# Altium schematic symbol library FPGA_Xilinx_Virtex7.SchLib: 34 symbols (part 9 of 34) (continued)
## XC7VH870T-FLG1932 (continued)
part P pins: AB22 VREFN_0 (io), AB23 VP_0 (io), AC22 VN_0 (io), AC23 VREFP_0 (io), AD22 DXN_0 (io), AD23 DXP_0 (io), AJ26 DONE_0 (io), AK19 INIT_B_0 (io), AL26 PROGRAM_B_0 (io), AM19 M2_0 (io), AM21 M1_0 (io), AM23 M0_0 (io), N20 TMS_0 (io), N22 TCK_0 (io), N26 TDO_0 (io), R20 TDI_0 (io), R26 CCLK_0 (io), V17 VCCO_0 (power), W16 VCCO_0 (power)
part Q pins: A3 GND (power), A4 GND (power), A7 GND (power), A38 GND (power), A41 GND (power), A42 GND (power), AA17 VCCINT (power), AA19 VCCAUX_IO_G2 (power), AA21 VCCINT (power), AA22 GNDADC (power), AA23 VCCADC (power), AA25 VCCAUX_IO_G0 (power), AA27 VCCINT (power), AA29 VCCINT (power), AB16 VCCINT (power), AB18 VCCAUX (power), AB20 VCCINT (power), AB24 VCCBRAM (power), AB26 VCCAUX (power), AB28 VCCINT (power), AC17 VCCINT (power), AC19 VCCAUX_IO_G2 (power), AC21 VCCINT (power), AC25 VCCAUX_IO_G0 (power), AC27 VCCINT (power), AC29 VCCINT (power), AD16 VCCINT (power), AD18 VCCAUX (power), AD20 VCCINT (power), AD24 VCCBRAM (power), AD26 VCCAUX (power), AD28 VCCINT (power), AE17 VCCINT (power), AE19 VCCINT (power), AE21 VCCINT (power), AE23 VCCINT (power), AE25 VCCINT (power), AE27 VCCINT (power), AE29 VCCINT (power), AF16 VCCINT (power), AF18 VCCAUX (power), AF20 VCCINT (power), AF22 VCCINT (power), AF24 VCCBRAM (power), AF26 VCCAUX (power), AF28 VCCINT (power), AG17 VCCINT (power), AG19 VCCINT (power), AG21 VCCINT (power), AG23 VCCINT (power), AG25 VCCINT (power), AG27 VCCINT (power), AG29 VCCINT (power), AH16 VCCINT (power), AH18 VCCAUX (power), AH20 VCCINT (power), AH22 VCCINT (power), AH24 VCCBRAM (power), AH26 VCCAUX (power), AH28 VCCINT (power), AJ17 VCCINT (power), AJ19 VCCINT (power), AJ21 VCCINT (power), AJ23 VCCINT (power), AJ25 VCCINT (power), AJ27 VCCINT (power), AK18 VCCINT (power), AK20 VCCINT (power), AK22 VCCINT (power), AK24 VCCBRAM (power), AK26 VCCINT (power), AL19 VCCINT (power), AL21 VCCINT (power), AL23 VCCINT (power), AL25 VCCINT (power), AL27 VCCINT (power), AM18 VCCINT (power), AM20 VCCINT (power), AM22 VCCINT (power), AM24 VCCBRAM (power), AM26 VCCINT (power), B2 GND (power), B5 GND (power), B7 GND (power), B38 GND (power), B40 GND (power), B43 GND (power), C4 GND (power), C7 GND (power), C38 GND (power), C41 GND (power), D1 GND (power), D6 GND (power), D7 GND (power), D38 GND (power), D39 GND (power), D44 GND (power), E3 GND (power), E4 GND (power), E7 GND (power), E8 GND (power), E9 GND (power), E10 GND (power), E11 GND (power), E12 GND (power), E13 GND (power), E14 GND (power), E15 GND (power), E16 GND (power), E17 GND (power), E19 GND (power), E22 GND (power), E23 GND (power), E26 GND (power), E27 GND (power), E28 GND (power), E29 GND (power), E30 GND (power), E31 GND (power), E32 GND (power), E33 GND (power), E34 GND (power), E35 GND (power), E36 GND (power), E37 GND (power), E38 GND (power), E41 GND (power), E42 GND (power), F1 GND (power), F2 GND (power), F6 GND (power), F9 GND (power), F17 GND (power), F19 GND (power), F21 GND (power), F23 GND (power), F25 GND (power), F27 GND (power), F28 GND (power), F36 GND (power), F39 GND (power), F43 GND (power), F44 GND (power), G4 GND (power), G7 GND (power), G8 GND (power), G9 GND (power), G14 GND (power), G17 GND (power), G19 GND (power), G22 GND (power), G23 GND (power), G24 GND (power), G25 GND (power), G28 GND (power), G34 GND (power), G36 GND (power), G37 GND (power), G38 GND (power), G41 GND (power), H1 GND (power), H6 GND (power), H9 GND (power), H11 GND (power), H17 GND (power), H18 GND (power), H19 GND (power), H20 GND (power), H21 GND (power), H23 GND (power), H24 GND (power), H25 GND (power), H27 GND (power), H28 GND (power), H31 GND (power), N19 VCCINT (power), N21 VCCINT (power), N23 VCCINT (power), N25 VCCINT (power), N27 VCCINT (power), P20 VCCINT (power), P22 VCCINT (power), P24 VCCBRAM (power), P26 VCCINT (power), R19 VCCINT (power), R21 VCCINT (power), R22 VCCBATT_0 (power), R23 VCCINT (power), R25 VCCINT (power), R27 VCCINT (power), T18 VCCINT (power), T20 VCCINT (power), T22 VCCINT (power), T24 VCCBRAM (power), T26 VCCINT (power), T28 VCCINT (power), U17 VCCINT (power), U19 VCCINT (power), U21 VCCINT (power), U23 VCCINT (power), U25 VCCINT (power), U27 VCCINT (power), U29 VCCINT (power), V16 VCCINT (power), V18 VCCAUX (power), V20 VCCINT (power), V22 VCCINT (power), V24 VCCBRAM (power), V26 VCCAUX (power), V28 VCCINT (power), W17 VCCINT (power), W19 VCCAUX_IO_G2 (power), W21 VCCINT (power), W23 VCCINT (power), W25 VCCAUX_IO_G0 (power), W27 VCCINT (power), W29 VCCINT (power), Y16 VCCINT (power), Y18 VCCAUX (power), Y20 VCCINT (power), Y22 VCCINT (power), Y24 VCCBRAM (power), Y26 VCCAUX (power), Y28 VCCINT (power)
part R pins: AA3 GND (power), AA4 GND (power), AA7 GND (power), AA11 GND (power), AA12 GND (power), AA16 GND (power), AA18 GND (power), AA20 GND (power), AA24 GND (power), AA26 GND (power), AA28 GND (power), AA32 GND (power), AA34 GND (power), AA38 GND (power), AA41 GND (power), AA42 GND (power), AB1 GND (power), AB2 GND (power), AB5 GND (power), AB9 GND (power), AB10 GND (power), AB11 GND (power), AB17 GND (power), AB19 GND (power), AB21 GND (power), AB25 GND (power), AB27 GND (power), AB29 GND (power), AB34 GND (power), AB35 GND (power), AB36 GND (power), AB40 GND (power), AB43 GND (power), AB44 GND (power), AC3 GND (power), AC7 GND (power), AC8 GND (power), AC11 GND (power), AC16 GND (power), AC18 GND (power), AC20 GND (power), AC24 GND (power), AC26 GND (power), AC28 GND (power), AC34 GND (power), AC37 GND (power), AC38 GND (power), AC42 GND (power), AD1 GND (power), AD5 GND (power), AD6 GND (power), AD9 GND (power), AD11 GND (power), AD13 GND (power), AD17 GND (power), AD19 GND (power), AD21 GND (power), AD25 GND (power), AD27 GND (power), AD29 GND (power), AD33 GND (power), AD34 GND (power), AD36 GND (power), AD39 GND (power), AD40 GND (power), AD44 GND (power), AE3 GND (power), AE4 GND (power), AE7 GND (power), AE11 GND (power), AE16 GND (power), AE18 GND (power), AE20 GND (power), AE22 GND (power), AE24 GND (power), AE26 GND (power), AE28 GND (power), AE30 GND (power), AE34 GND (power), AE38 GND (power), AE41 GND (power), AE42 GND (power), AF1 GND (power), AF2 GND (power), AF5 GND (power), AF9 GND (power), AF10 GND (power), AF11 GND (power), AF17 GND (power), AF19 GND (power), AF21 GND (power), AF23 GND (power), AF25 GND (power), AF27 GND (power), AF29 GND (power), AF34 GND (power), AF35 GND (power), AF36 GND (power), AF40 GND (power), AF43 GND (power), AF44 GND (power), AG3 GND (power), AG7 GND (power), H36 GND (power), H39 GND (power), H44 GND (power), J3 GND (power), J4 GND (power), J7 GND (power), J9 GND (power), J17 GND (power), J18 GND (power), J20 GND (power), J24 GND (power), J26 GND (power), J28 GND (power), J36 GND (power), J38 GND (power), J41 GND (power), J42 GND (power), K1 GND (power), K2 GND (power), K5 GND (power), K9 GND (power), K10 GND (power), K11 GND (power), K15 GND (power), K17 GND (power), K18 GND (power), K21 GND (power), K22 GND (power), K23 GND (power), K24 GND (power), K25 GND (power), K26 GND (power), K27 GND (power), K28 GND (power), K34 GND (power), K35 GND (power), K36 GND (power), K40 GND (power), K43 GND (power), K44 GND (power), L3 GND (power), L7 GND (power), L8 GND (power), L11 GND (power), L12 GND (power), L18 GND (power), L19 GND (power), L21 GND (power), L23 GND (power), L25 GND (power), L27 GND (power), L32 GND (power), L34 GND (power), L37 GND (power), L38 GND (power), L42 GND (power), M1 GND (power), M5 GND (power), M6 GND (power), M9 GND (power), M10 GND (power), M11 GND (power), M19 GND (power), M20 GND (power), M21 GND (power), M22 GND (power), M23 GND (power), M24 GND (power), M25 GND (power), M26 GND (power), M27 GND (power), M29 GND (power), M34 GND (power), M35 GND (power), M36 GND (power), M39 GND (power), M40 GND (power), M44 GND (power), N3 GND (power), N4 GND (power), N7 GND (power), N11 GND (power), N16 GND (power), N24 GND (power), N34 GND (power), N38 GND (power), N41 GND (power), N42 GND (power), P1 GND (power), P2 GND (power), P5 GND (power), P9 GND (power), P10 GND (power), P11 GND (power), P13 GND (power), P19 GND (power), P21 GND (power), P23 GND (power), P25 GND (power), P27 GND (power), P33 GND (power), P34 GND (power), P35 GND (power), P36 GND (power), P40 GND (power), P43 GND (power), P44 GND (power), R3 GND (power), R7 GND (power), R8 GND (power), R11 GND (power), R18 GND (power), R24 GND (power), R30 GND (power), R34 GND (power), R37 GND (power), R38 GND (power), R42 GND (power), T1 GND (power), T5 GND (power), T6 GND (power), T9 GND (power), T11 GND (power), T17 GND (power), T19 GND (power), T21 GND (power), T23 GND (power), T25 GND (power), T27 GND (power), T34 GND (power), T36 GND (power), T39 GND (power), T40 GND (power), T44 GND (power), U3 GND (power), U7 GND (power), U11 GND (power), U14 GND (power), U16 GND (power), U18 GND (power), U20 GND (power), U22 GND (power), U24 GND (power), U26 GND (power), U28 GND (power), U34 GND (power), U38 GND (power), U42 GND (power), V1 GND (power), V5 GND (power), V9 GND (power), V10 GND (power), V11 GND (power), V19 GND (power), V21 GND (power), V23 GND (power), V25 GND (power), V27 GND (power), V29 GND (power), V31 GND (power), V34 GND (power), V35 GND (power), V36 GND (power), V40 GND (power), V44 GND (power), W3 GND (power), W7 GND (power), W8 GND (power), W11 GND (power), W18 GND (power), W20 GND (power), W22 GND (power), W24 GND (power), W26 GND (power), W28 GND (power), W34 GND (power), W37 GND (power), W38 GND (power), W42 GND (power), Y1 GND (power), Y5 GND (power), Y6 GND (power), Y9 GND (power), Y10 GND (power), Y11 GND (power), Y15 GND (power), Y17 GND (power), Y19 GND (power), Y21 GND (power), Y23 GND (power), Y25 GND (power), Y27 GND (power), Y29 GND (power), Y34 GND (power), Y35 GND (power), Y36 GND (power), Y39 GND (power), Y40 GND (power), Y44 GND (power)
part S pins: AG11 GND (power), AG14 GND (power), AG16 GND (power), AG18 GND (power), AG20 GND (power), AG22 GND (power), AG24 GND (power), AG26 GND (power), AG28 GND (power), AG34 GND (power), AG38 GND (power), AG42 GND (power), AH1 GND (power), AH5 GND (power), AH9 GND (power), AH10 GND (power), AH11 GND (power), AH17 GND (power), AH19 GND (power), AH21 GND (power), AH23 GND (power), AH25 GND (power), AH27 GND (power), AH29 GND (power), AH31 GND (power), AH34 GND (power), AH35 GND (power), AH36 GND (power), AH40 GND (power), AH44 GND (power), AJ3 GND (power), AJ4 GND (power), AJ7 GND (power), AJ11 GND (power), AJ16 GND (power), AJ18 GND (power), AJ20 GND (power), AJ22 GND (power), AJ24 GND (power), AJ28 GND (power), AJ34 GND (power), AJ38 GND (power), AJ41 GND (power), AJ42 GND (power), AK1 GND (power), AK5 GND (power), AK9 GND (power), AK11 GND (power), AK15 GND (power), AK17 GND (power), AK21 GND (power), AK23 GND (power), AK25 GND (power), AK27 GND (power), AK34 GND (power), AK36 GND (power), AK40 GND (power), AK44 GND (power), AL3 GND (power), AL7 GND (power), AL8 GND (power), AL11 GND (power), AL12 GND (power), AL18 GND (power), AL20 GND (power), AL22 GND (power), AL24 GND (power), AL32 GND (power), AL34 GND (power), AL37 GND (power), AL38 GND (power), AL42 GND (power), AM1 GND (power), AM5 GND (power), AM6 GND (power), AM9 GND (power), AM10 GND (power), AM11 GND (power), AM25 GND (power), AM27 GND (power), AM29 GND (power), AM34 GND (power), AM35 GND (power), AM36 GND (power), AM39 GND (power), AM40 GND (power), AM44 GND (power), AN3 GND (power), AN4 GND (power), AN8 GND (power), AN11 GND (power), AN16 GND (power), AN18 GND (power), AN19 GND (power), AN20 GND (power), AN21 GND (power), AN22 GND (power), AN23 GND (power), AN24 GND (power), AN25 GND (power), AN26 GND (power), AN27 GND (power), AN34 GND (power), AN37 GND (power), AN41 GND (power), AN42 GND (power), AP1 GND (power), AP2 GND (power), AP5 GND (power), AP6 GND (power), AP9 GND (power), AP10 GND (power), AP11 GND (power), AP13 GND (power), AP18 GND (power), AP20 GND (power), AP22 GND (power), AP24 GND (power), AP26 GND (power), AP27 GND (power), AP33 GND (power), AP34 GND (power), AP35 GND (power), AP36 GND (power), AP39 GND (power), AP40 GND (power), AP43 GND (power), AP44 GND (power), AR4 GND (power), AR7 GND (power), AR9 GND (power), AR10 GND (power), AR17 GND (power), AR18 GND (power), AR19 GND (power), AR20 GND (power), AR21 GND (power), AR22 GND (power), AR23 GND (power), AR24 GND (power), AR27 GND (power), AR28 GND (power), AR30 GND (power), AR36 GND (power), AR38 GND (power), AR41 GND (power), AT1 GND (power), AT6 GND (power), AT9 GND (power), AT17 GND (power), AT19 GND (power), AT21 GND (power), AT25 GND (power), AT27 GND (power), AT28 GND (power), AT36 GND (power), AT39 GND (power), AT44 GND (power), AU3 GND (power), AU4 GND (power), AU7 GND (power), AU8 GND (power), AU9 GND (power), AU14 GND (power), AU17 GND (power), AU18 GND (power), AU20 GND (power), AU21 GND (power), AU22 GND (power), AU24 GND (power), AU25 GND (power), AU26 GND (power), AU27 GND (power), AU28 GND (power), AU34 GND (power), AU36 GND (power), AU37 GND (power), AU38 GND (power), AU41 GND (power), AU42 GND (power), AV1 GND (power), AV2 GND (power), AV6 GND (power), AV9 GND (power), AV11 GND (power), AV17 GND (power), AV20 GND (power), AV21 GND (power), AV22 GND (power), AV23 GND (power), AV26 GND (power), AV28 GND (power), AV31 GND (power), AV36 GND (power), AV39 GND (power), AV43 GND (power), AV44 GND (power), AW4 GND (power), AW7 GND (power), AW8 GND (power), AW9 GND (power), AW17 GND (power), AW18 GND (power), AW20 GND (power), AW22 GND (power), AW24 GND (power), AW26 GND (power), AW28 GND (power), AW36 GND (power), AW37 GND (power), AW38 GND (power), AW41 GND (power), AY1 GND (power), AY6 GND (power), AY7 GND (power), AY8 GND (power), AY9 GND (power), AY10 GND (power), AY11 GND (power), AY12 GND (power), AY13 GND (power), AY14 GND (power), AY15 GND (power), AY16 GND (power), AY17 GND (power), AY18 GND (power), AY19 GND (power), AY22 GND (power), AY23 GND (power), AY26 GND (power), AY28 GND (power), AY29 GND (power), AY30 GND (power), AY31 GND (power), AY32 GND (power), AY33 GND (power), AY34 GND (power), AY35 GND (power), AY36 GND (power), AY37 GND (power), AY38 GND (power), AY39 GND (power), AY44 GND (power), BA3 GND (power), BA4 GND (power), BA7 GND (power), BA38 GND (power), BA41 GND (power), BA42 GND (power), BB1 GND (power), BB2 GND (power), BB5 GND (power), BB7 GND (power), BB38 GND (power), BB40 GND (power), BB43 GND (power), BB44 GND (power), BC2 GND (power), BC4 GND (power), BC7 GND (power), BC38 GND (power), BC41 GND (power), BC43 GND (power), BD5 GND (power), BD6 GND (power), BD7 GND (power), BD38 GND (power), BD39 GND (power), BD40 GND (power)

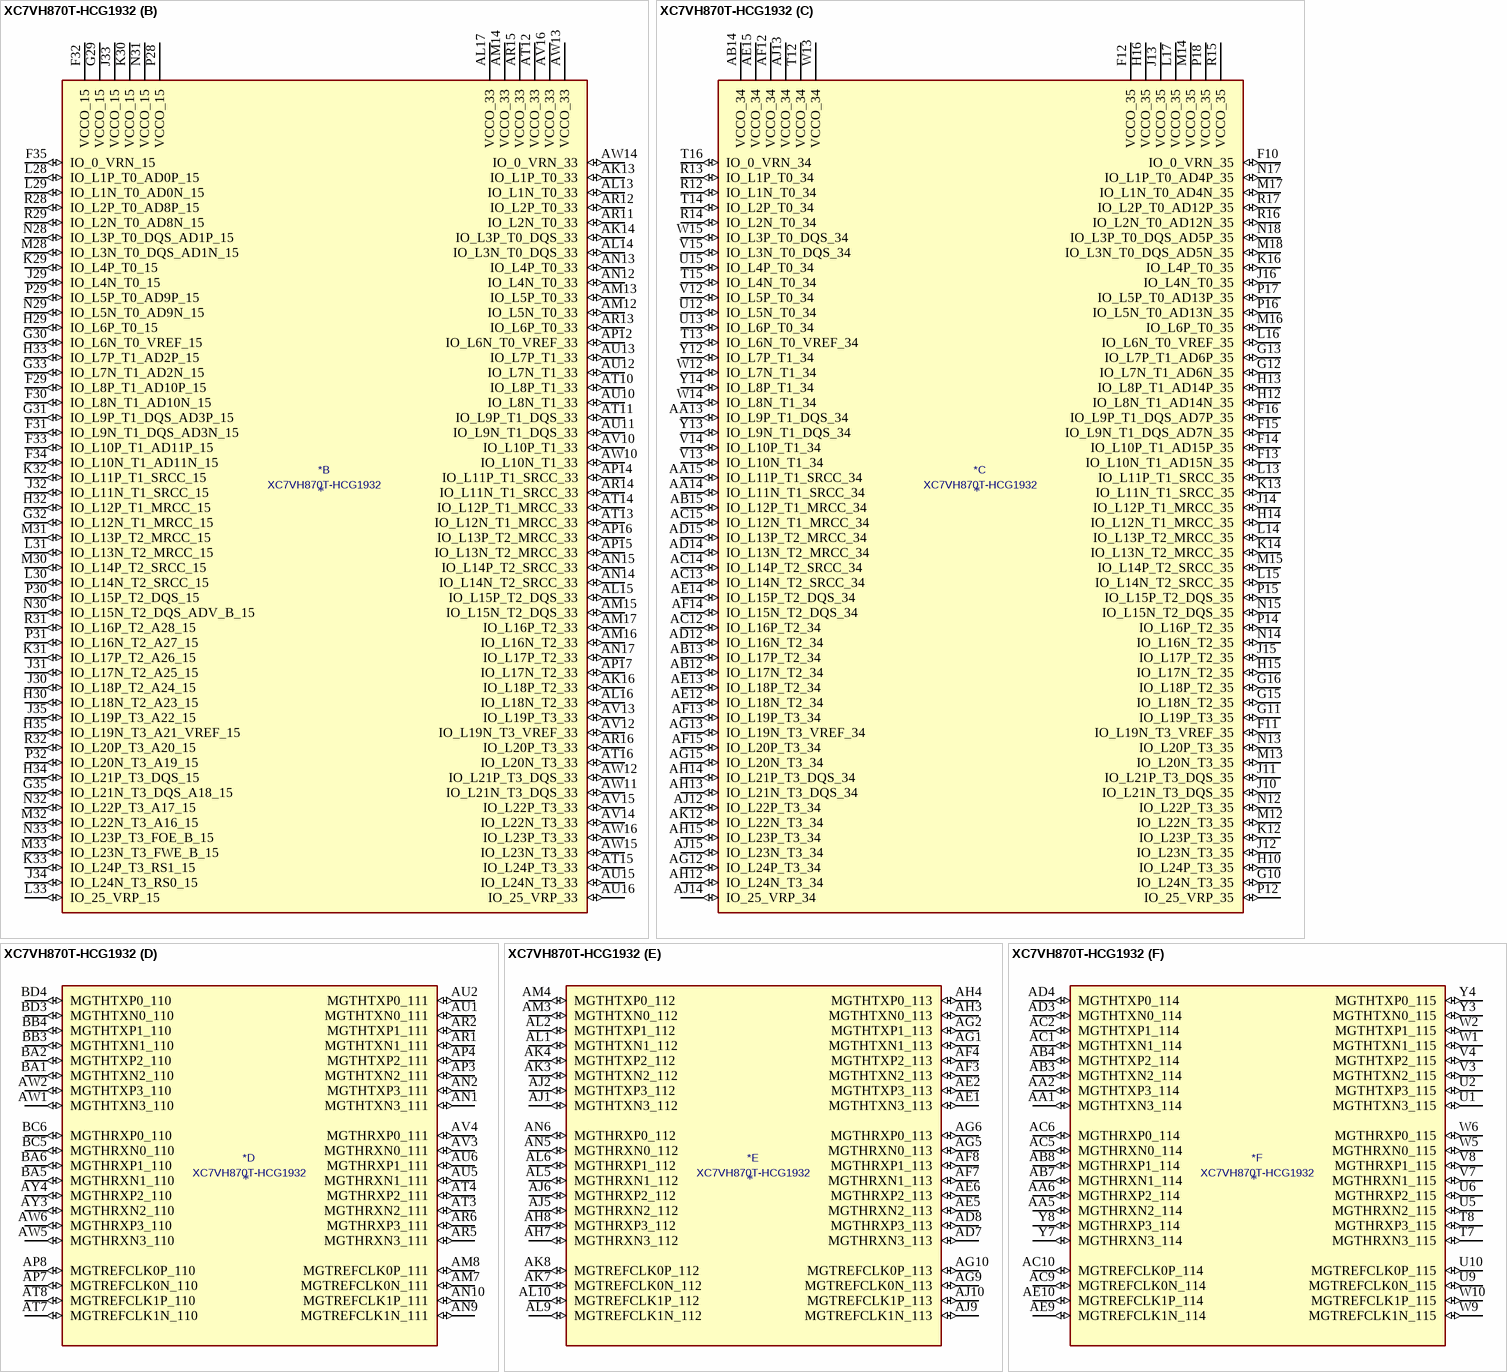
[diagram p47: symbol XC7VH870T-HCG1932]

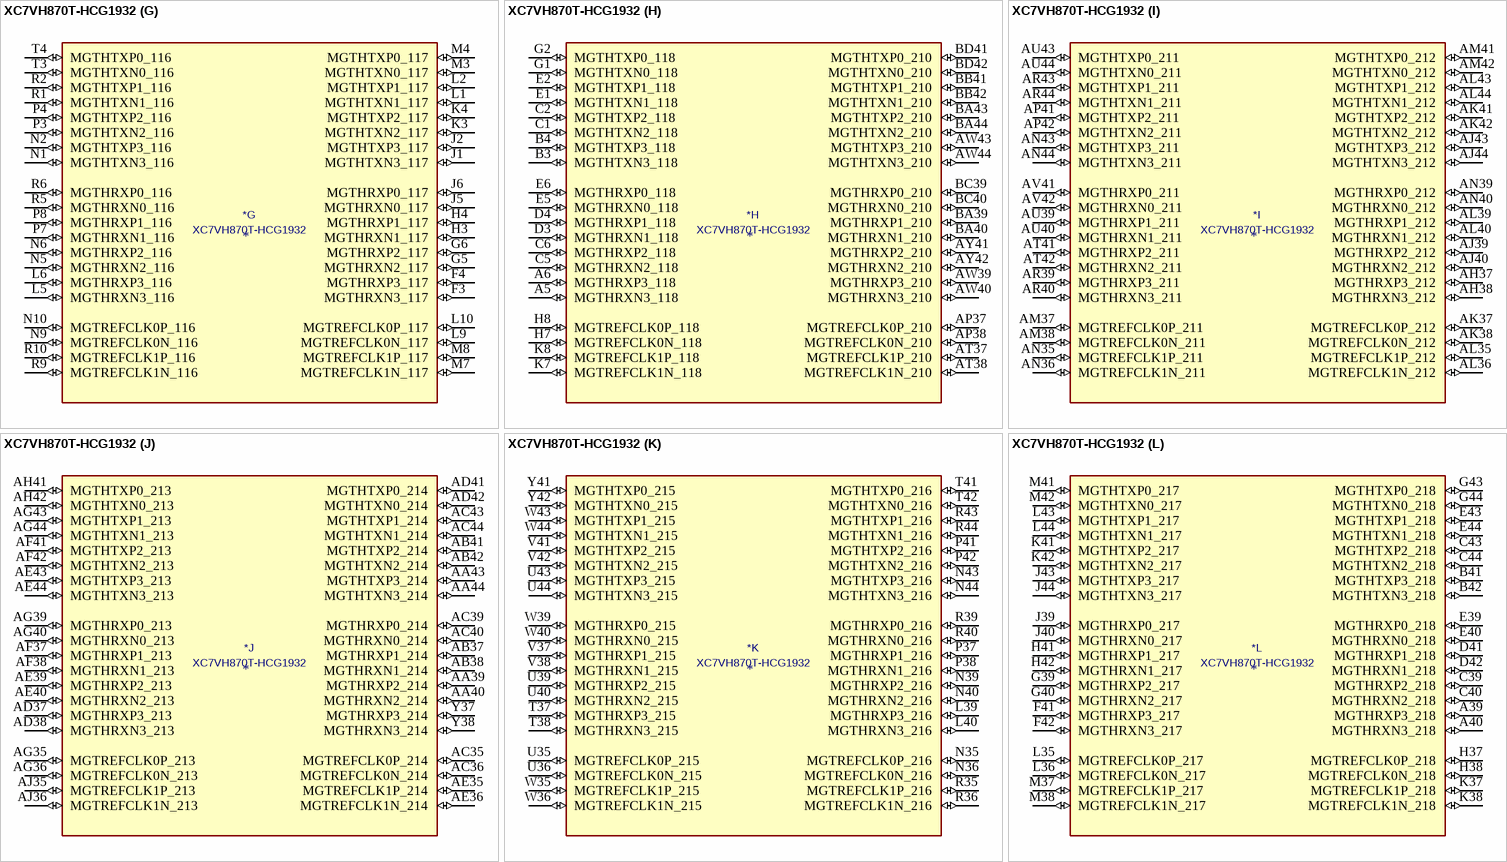
[diagram p48: symbol XC7VH870T-HCG1932]

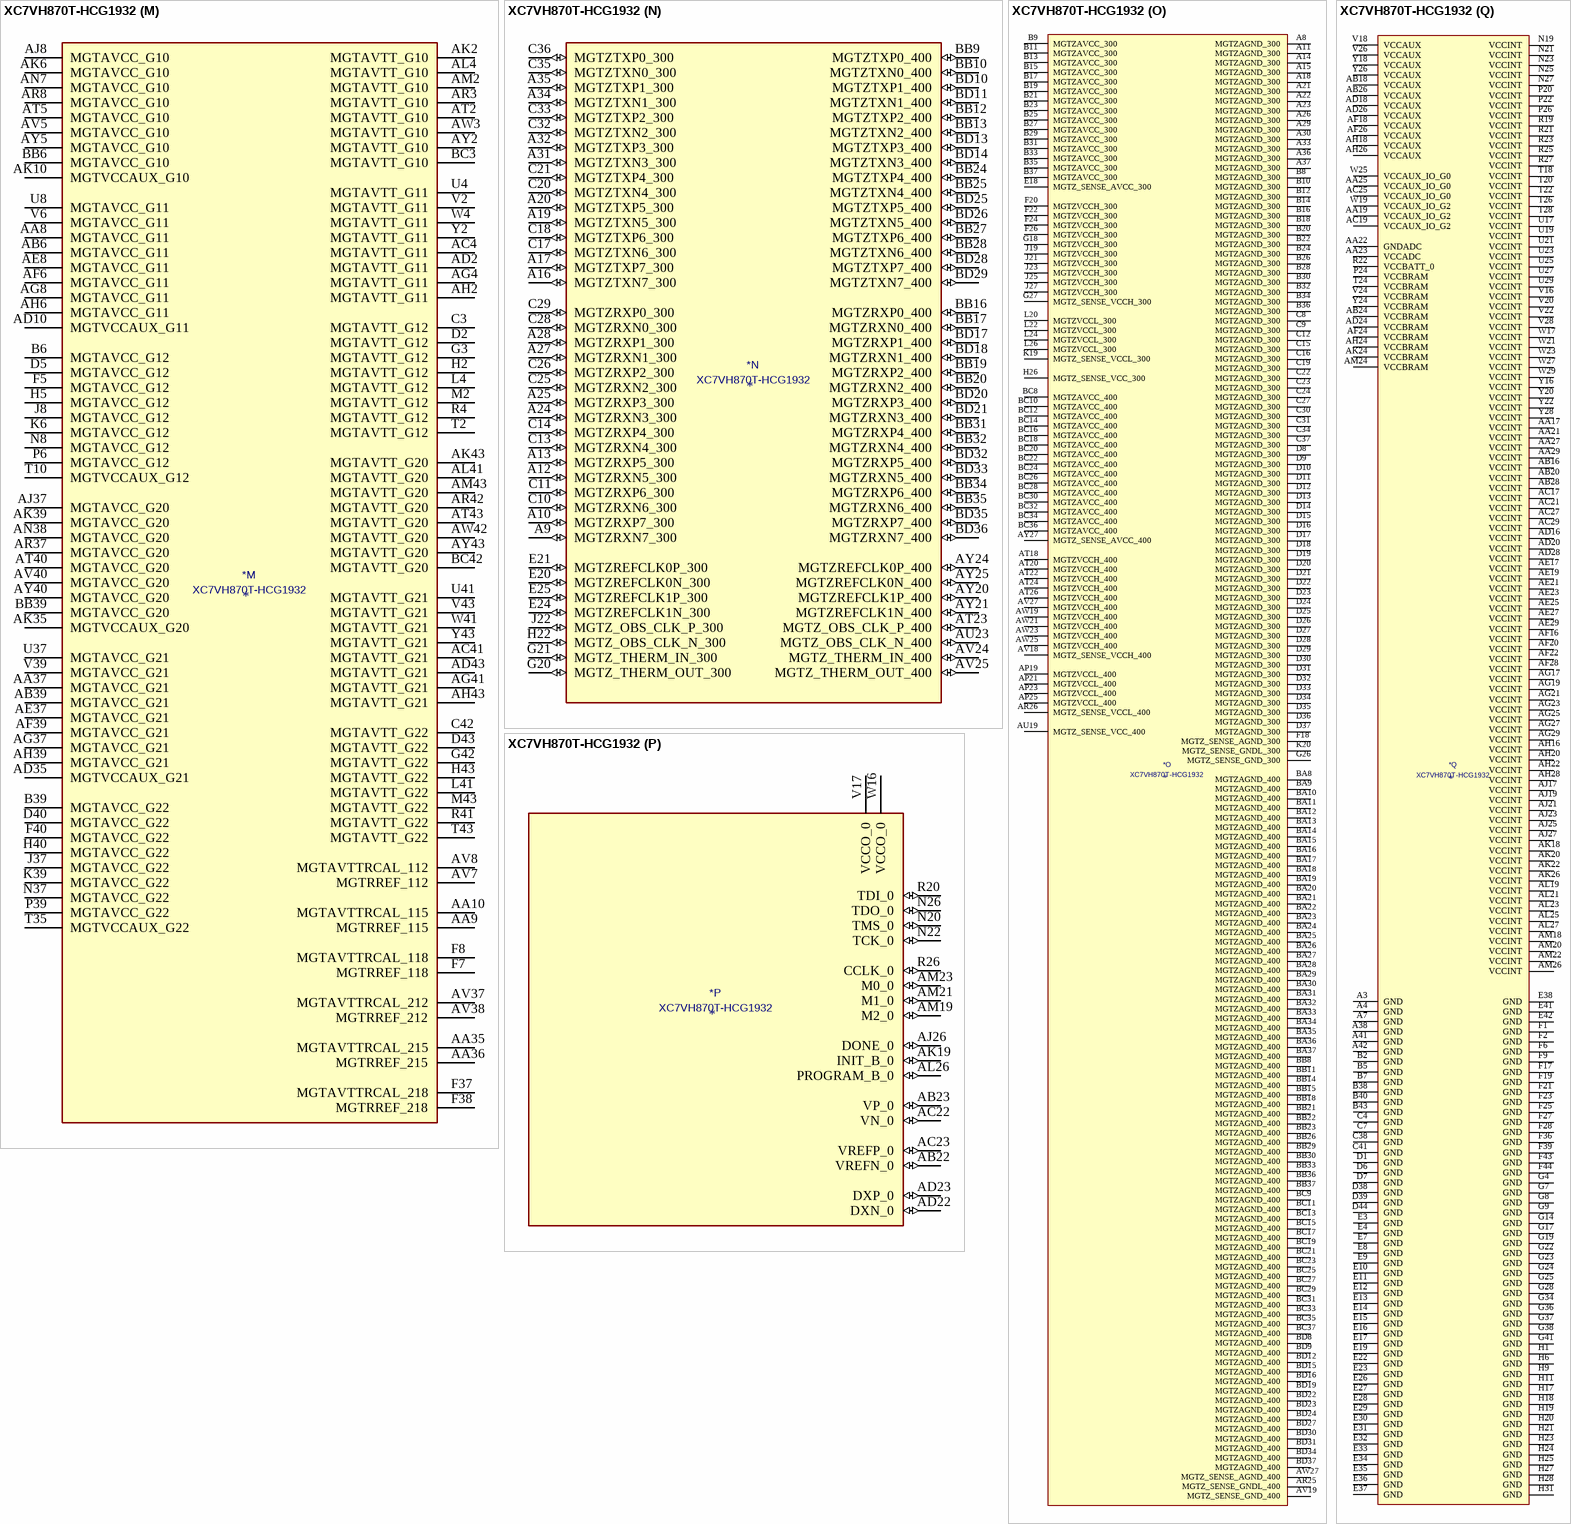
[diagram p49: symbol XC7VH870T-HCG1932]

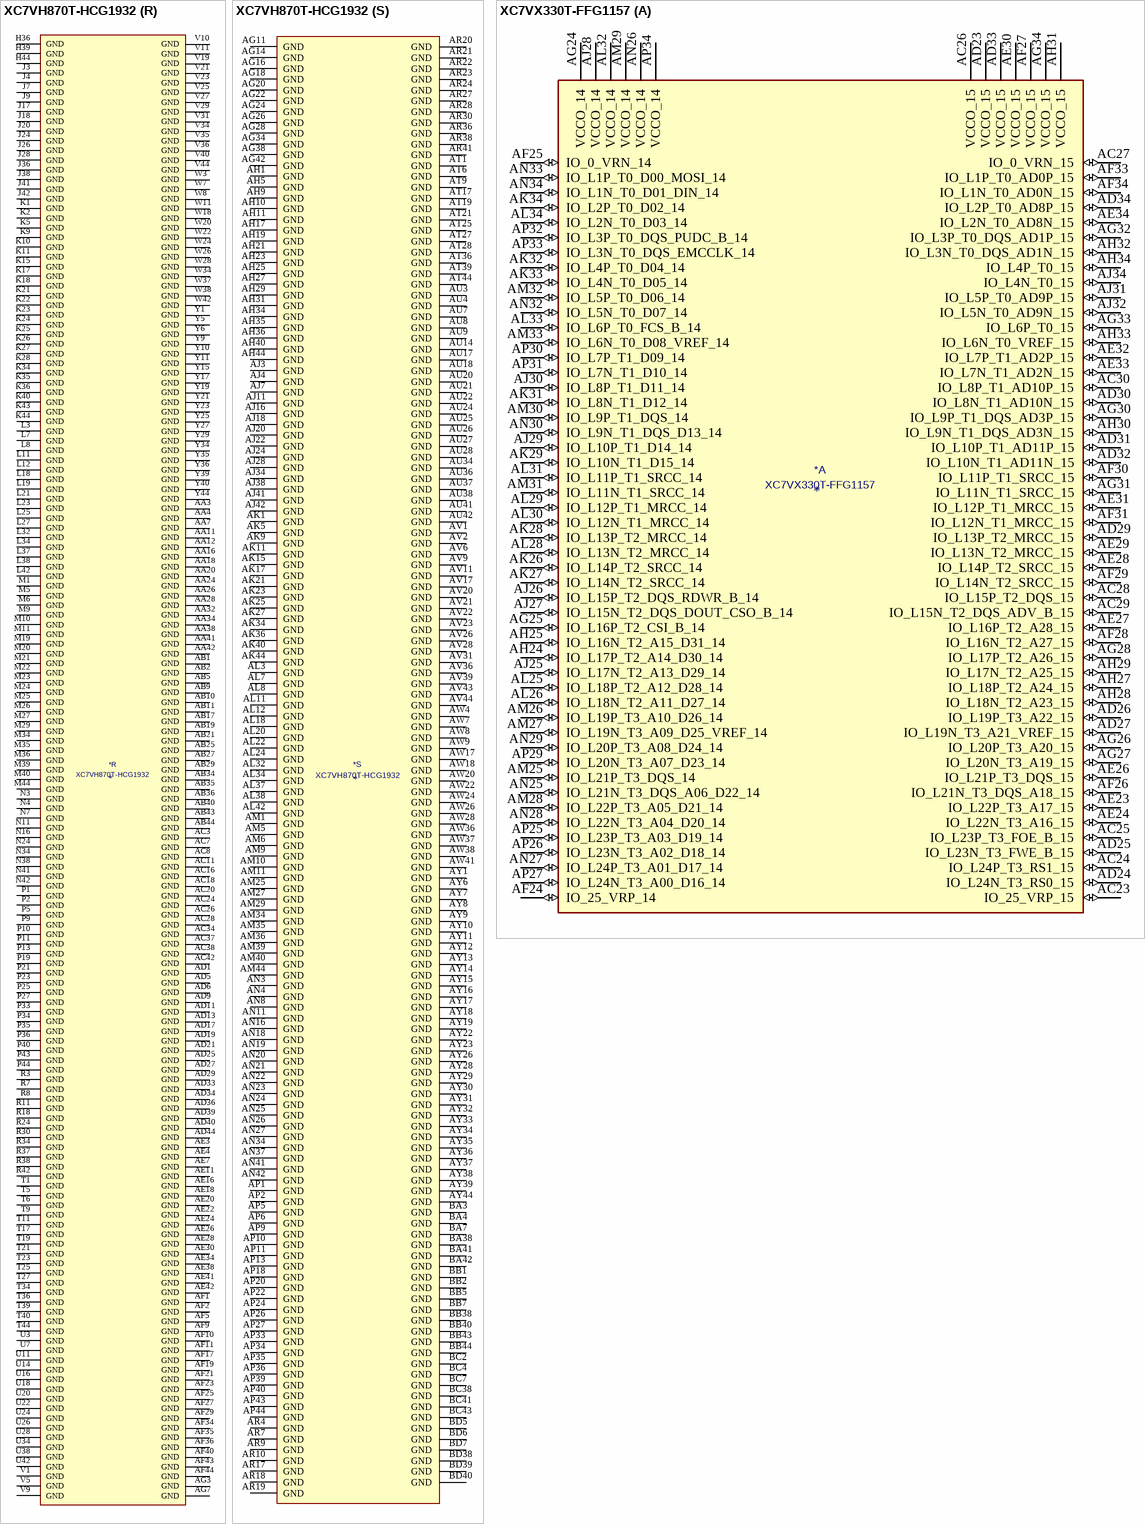
[diagram p50: symbols XC7VH870T-HCG1932 to XC7VX330T-FFG1157]